# Altium footprint library Cty1.PcbLib: 1378 footprints (part 21 of 87)
Each footprint in its own frame and in the unit in brackets; x right, y up, seen from the top. Pads: shape width x height; smd on the part's side, far side on the other; paste and mask are expansions set on the pad; w line width, h text height; cw(c..) or ccw(c..) is an arc to the next point about the centre after c.
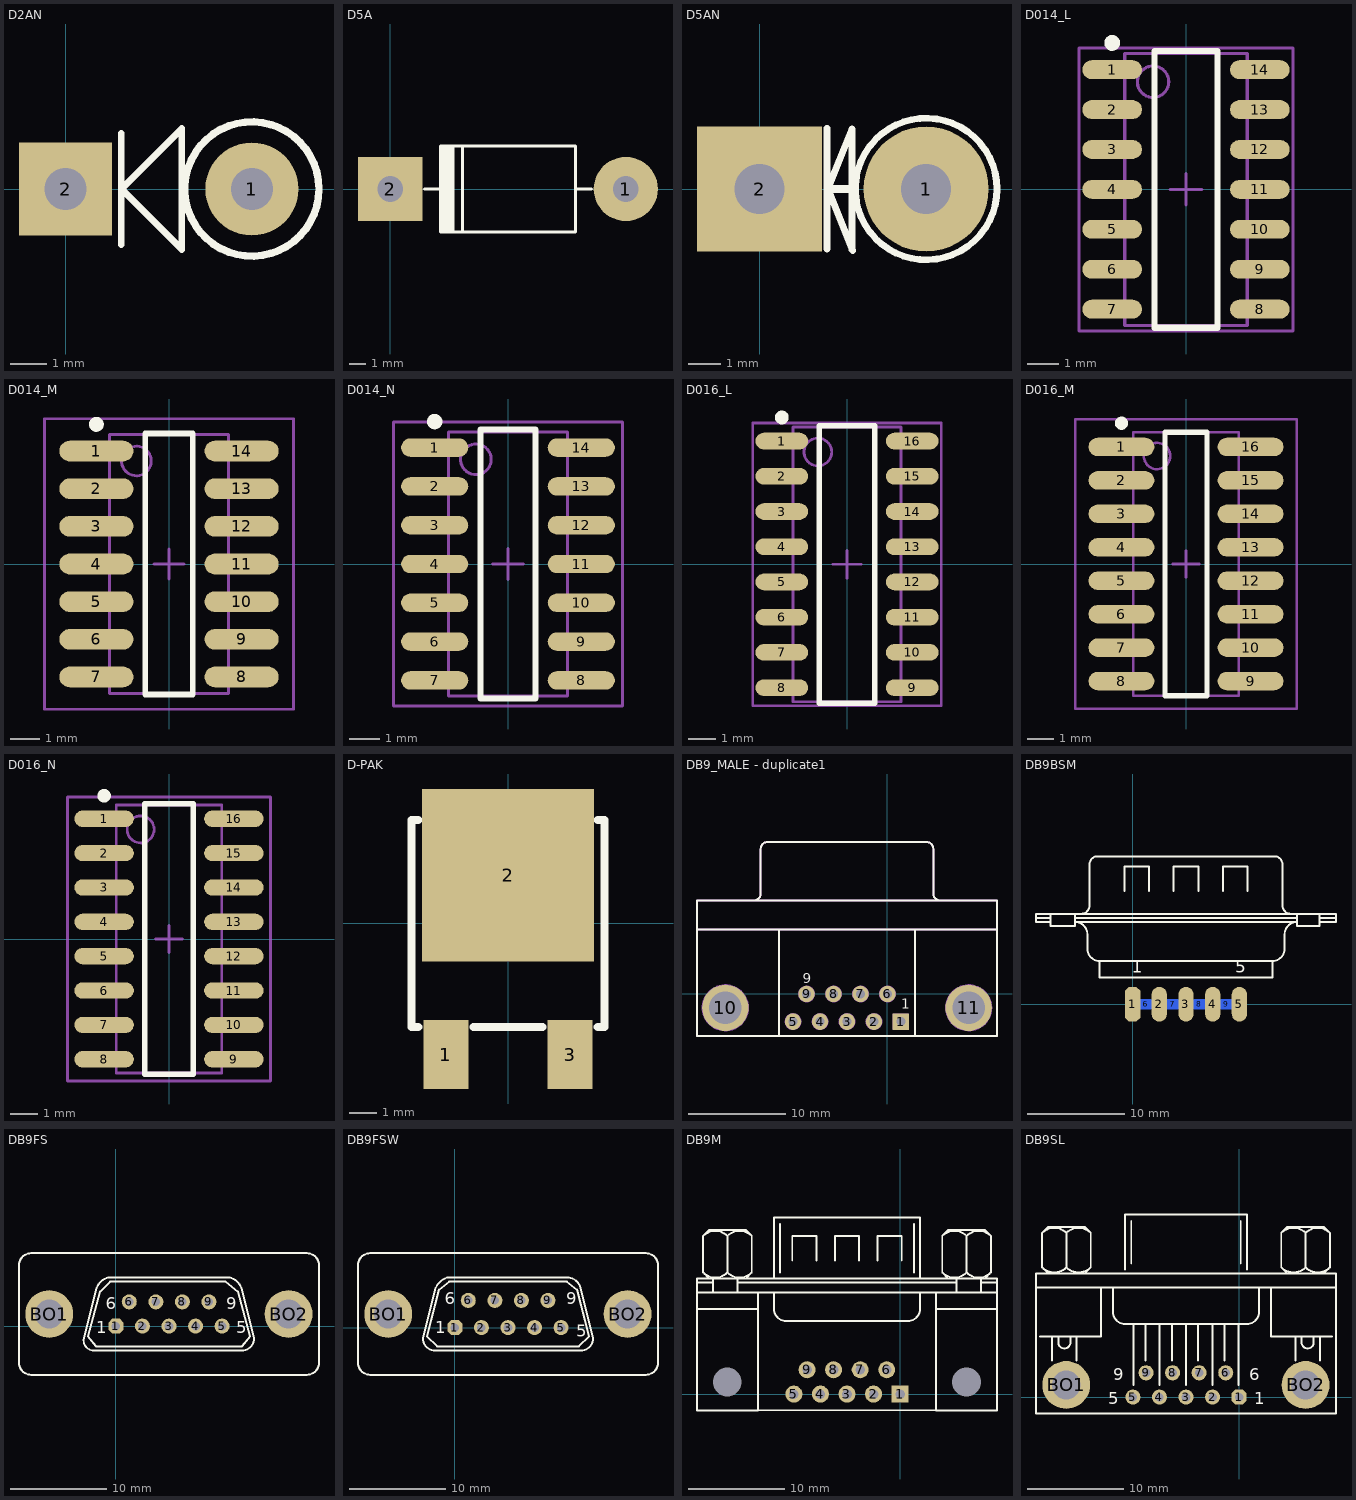
[diagram p20: the footprints below, top view; thin cyan lines are the x and y axes]

## D2AN [mil] "Diode 2A, W 150mil, L 450mil"
height 100
pads (2):
  round 100 hole 45: 1(200,0)
  rect 100x100 hole 45: 2(0,0)
Top Overlay:
  circle w8: c200,0 r72.11
  lines w7: 60,-60 60,60 ; 125,50 125,65 60,0 125,-65 125,55
3D body "SW3dPS-Zener 1W_Stand.STEP": height 252.32, standoff -78.14, extent 46.01,-49.99 214.01,55

## D5A [mil] "Diode 5A, W 200mil, L 550mil"
height 150
pads (2):
  round 150 hole 60: 1(550,0)
  rect 150x150 hole 60: 2(0,0)
Top Overlay:
  rectangle: 120,-100 150,100
  lines w7: 80,0 118,0 ; 118,-44 118,0 ; 118,46 118,0 ; 169,-99 169,100 ; 432,0 470,0 ; 118,-100 118,100 432,100 432,-100 118,-100
3D body "User Library-BYW98.step": height 254.33, standoff -86.22, extent -51.87,-106 589.87,102.66

## D5AN [mil] "Diode 5A, W 200mil, L 250mil"
height 150
pads (2):
  round 150 hole 60: 1(200,0)
  rect 150x150 hole 60: 2(0,0)
Top Overlay:
  circle w8: c200,0 r85
  lines w8: 81,-72 81,73 ; 82,0 111,72 111,-73 ; 83,-2 112,-74
  lines w10: 82,0 113,0
3D body "SW3dPS-Zener 1W_Stand.STEP": height 252.32, standoff -78.14, extent 21,-73.99 189,31

## D014_L [mm] "SOIC, 14-Leads, Body 8.7x3.9mm, Pitch 1.27mm, IPC High Density"
height 1.75
pads (14):
  oval 1.9x0.6 smd: 1(-2.35,3.81) 2(-2.35,2.54) 3(-2.35,1.27) 4(-2.35,0) 5(-2.35,-1.27) 6(-2.35,-2.54) 7(-2.35,-3.81) 8(2.35,-3.81) 9(2.35,-2.54) 10(2.35,-1.27) 11(2.35,0) 12(2.35,1.27) 13(2.35,2.54) 14(2.35,3.81)
Top Overlay:
  circle w0.25: c-2.35,4.66 r0.125
  lines w0.2: -1,-4.4 -1,4.4 1,4.4 1,-4.4 -1,-4.4
Mechanical 13:
  circle w0.1: c-1.05,3.425 r0.5
  lines w0.1: -1.95,-4.325 -1.95,4.325 1.95,4.325 1.95,-4.325 -1.95,-4.325
Mechanical 15:
  lines w0.1: -0.5,0 0.5,0 ; 0,-0.5 0,0.5 ; -3.4,-4.5 -3.4,4.5 3.4,4.5 3.4,-4.5 -3.4,-4.5
3D body: height 1.75, standoff 0, extent -1.95,-4.325 1.95,4.325

## D014_M [mm] "SOIC, 14-Leads, Body 8.7x3.9mm, Pitch 1.27mm, IPC Low Density"
height 1.75
pads (14):
  oval 2.5x0.7 smd: 1(-2.45,3.81) 2(-2.45,2.54) 3(-2.45,1.27) 4(-2.45,0) 5(-2.45,-1.27) 6(-2.45,-2.54) 7(-2.45,-3.81) 8(2.45,-3.81) 9(2.45,-2.54) 10(2.45,-1.27) 11(2.45,0) 12(2.45,1.27) 13(2.45,2.54) 14(2.45,3.81)
Top Overlay:
  circle w0.25: c-2.45,4.71 r0.125
  lines w0.2: -0.8,-4.4 -0.8,4.4 0.8,4.4 0.8,-4.4 -0.8,-4.4
Mechanical 13:
  circle w0.1: c-1.1,3.475 r0.5
  lines w0.1: -2,-4.375 -2,4.375 2,4.375 2,-4.375 -2,-4.375
Mechanical 15:
  lines w0.1: -0.5,0 0.5,0 ; 0,-0.5 0,0.5 ; -4.2,-4.9 -4.2,4.9 4.2,4.9 4.2,-4.9 -4.2,-4.9
3D body: height 1.75, standoff 0, extent -2,-4.375 2,4.375

## D014_N [mm] "SOIC, 14-Leads, Body 8.7x3.9mm, Pitch 1.27mm, IPC Medium Density"
height 1.75
pads (14):
  oval 2.2x0.6 smd: 1(-2.4,3.81) 2(-2.4,2.54) 3(-2.4,1.27) 4(-2.4,0) 5(-2.4,-1.27) 6(-2.4,-2.54) 7(-2.4,-3.81) 8(2.4,-3.81) 9(2.4,-2.54) 10(2.4,-1.27) 11(2.4,0) 12(2.4,1.27) 13(2.4,2.54) 14(2.4,3.81)
Top Overlay:
  circle w0.25: c-2.4,4.66 r0.125
  lines w0.2: -0.9,-4.4 -0.9,4.4 0.9,4.4 0.9,-4.4 -0.9,-4.4
Mechanical 13:
  circle w0.1: c-1.05,3.425 r0.5
  lines w0.1: -1.95,-4.325 -1.95,4.325 1.95,4.325 1.95,-4.325 -1.95,-4.325
Mechanical 15:
  lines w0.1: -0.5,0 0.5,0 ; 0,-0.5 0,0.5 ; -3.75,-4.65 -3.75,4.65 3.75,4.65 3.75,-4.65 -3.75,-4.65
3D body: height 1.75, standoff 0, extent -1.95,-4.325 1.95,4.325

## D016_L [mm] "SOIC, 16-Leads, Body 9.9x3.9mm, Pitch 1.27mm, IPC High Density"
height 1.75
pads (16):
  oval 1.9x0.6 smd: 1(-2.35,4.445) 2(-2.35,3.175) 3(-2.35,1.905) 4(-2.35,0.635) 5(-2.35,-0.635) 6(-2.35,-1.905) 7(-2.35,-3.175) 8(-2.35,-4.445) 9(2.35,-4.445) 10(2.35,-3.175) 11(2.35,-1.905) 12(2.35,-0.635) 13(2.35,0.635) 14(2.35,1.905) 15(2.35,3.175) 16(2.35,4.445)
Top Overlay:
  circle w0.25: c-2.35,5.295 r0.125
  lines w0.2: -1,-5 -1,5 1,5 1,-5 -1,-5
Mechanical 13:
  circle w0.1: c-1.05,4.05 r0.5
  lines w0.1: -1.95,-4.95 -1.95,4.95 1.95,4.95 1.95,-4.95 -1.95,-4.95
Mechanical 15:
  lines w0.1: -0.5,0 0.5,0 ; 0,-0.5 0,0.5 ; -3.4,-5.1 -3.4,5.1 3.4,5.1 3.4,-5.1 -3.4,-5.1
3D body: height 1.75, standoff 0, extent -1.95,-4.95 1.95,4.95

## D016_M [mm] "SOIC, 16-Leads, Body 9.9x3.9mm, Pitch 1.27mm, IPC Low Density"
height 1.75
pads (16):
  oval 2.5x0.7 smd: 1(-2.45,4.445) 2(-2.45,3.175) 3(-2.45,1.905) 4(-2.45,0.635) 5(-2.45,-0.635) 6(-2.45,-1.905) 7(-2.45,-3.175) 8(-2.45,-4.445) 9(2.45,-4.445) 10(2.45,-3.175) 11(2.45,-1.905) 12(2.45,-0.635) 13(2.45,0.635) 14(2.45,1.905) 15(2.45,3.175) 16(2.45,4.445)
Top Overlay:
  circle w0.25: c-2.45,5.345 r0.125
  lines w0.2: -0.8,-5 0.8,-5 0.8,5 -0.8,5 -0.8,-5
Mechanical 13:
  circle w0.1: c-1.1,4.1 r0.5
  lines w0.1: -2,-5 2,-5 2,5 -2,5 -2,-5
Mechanical 15:
  lines w0.1: -0.5,0 0.5,0 ; 0,-0.5 0,0.5 ; -4.2,-5.5 4.2,-5.5 4.2,5.5 -4.2,5.5 -4.2,-5.5
3D body: height 1.75, standoff 0, extent -2,-5 2,5

## D016_N [mm] "SOIC, 16-Leads, Body 9.9x3.9mm, Pitch 1.27mm, IPC Medium Density"
height 1.75
pads (16):
  oval 2.2x0.6 smd: 1(-2.4,4.445) 2(-2.4,3.175) 3(-2.4,1.905) 4(-2.4,0.635) 5(-2.4,-0.635) 6(-2.4,-1.905) 7(-2.4,-3.175) 8(-2.4,-4.445) 9(2.4,-4.445) 10(2.4,-3.175) 11(2.4,-1.905) 12(2.4,-0.635) 13(2.4,0.635) 14(2.4,1.905) 15(2.4,3.175) 16(2.4,4.445)
Top Overlay:
  circle w0.25: c-2.4,5.295 r0.125
  lines w0.2: -0.9,-5 0.9,-5 0.9,5 -0.9,5 -0.9,-5
Mechanical 13:
  circle w0.1: c-1.05,4.05 r0.5
  lines w0.1: -1.95,-4.95 1.95,-4.95 1.95,4.95 -1.95,4.95 -1.95,-4.95
Mechanical 15:
  lines w0.1: -0.5,0 0.5,0 ; 0,-0.5 0,0.5 ; -3.75,-5.25 3.75,-5.25 3.75,5.25 -3.75,5.25 -3.75,-5.25
3D body: height 1.75, standoff 0, extent -1.95,-4.95 1.95,4.95

## D-PAK [mil]
pads (3):
  rect 65x100 smd: 1(-90,-190) 3(90,-190)
  rect 250x250 smd: 2(0,70)
Top Overlay:
  lines w12: -130,-150 -140,-150 -140,150 -130,150 ; -50,-150 50,-150 ; 130,-150 140,-150 140,150 130,150
3D body "User Library-TO252AA.step": height 90.55, standoff -0.35, extent -130,-210.95 129.06,170.95

## DB9_MALE - duplicate1 [mm]
pads (11):
  rect 1.69x1.69 hole 0.9: 1(1.385,-2.84)
  round 1.69 hole 0.9: 2(-1.385,-2.84) 3(-4.155,-2.84) 4(-6.925,-2.84) 5(-9.695,-2.84) 6(0,0) 7(-2.77,0) 8(-5.54,0) 9(-8.31,0)
  round 4.76 hole 3.3: 10(-16.65,-1.42) 11(8.34,-1.42)
Top Overlay:
  lines w0.2: -19.555,6.604 11.245,6.604 ; -13.715,9.609 ccw(c-13.715,10.304) -13.02,10.304 -13.02,14.904 ; -13.015,14.909 cw(c-12.32,14.909) -12.32,15.604 4.01,15.604 cw(c4.01,14.909) 4.705,14.909 ; -11.155,-4.32 -11.155,6.604 ; 2.845,-4.32 2.845,6.604 ; 4.71,14.904 4.71,10.304 ccw(c5.405,10.304) 5.405,9.609 ; -19.555,-4.32 -19.555,9.604 11.245,9.604 11.245,-4.32 -19.555,-4.32
  text "1" at 1.4,-1.5 h1
  text "9" at -8.709,1.095 h1
Mechanical 7:
  circle w0.2: c-1.385,-2.84 r0.773
  circle w0.2: c-4.155,-2.84 r0.773
  circle w0.2: c-6.925,-2.84 r0.773
  circle w0.2: c-9.695,-2.84 r0.773
  circle w0.2: c-8.31,0 r0.773
  circle w0.2: c-5.54,0 r0.773
  circle w0.2: c-2.77,0 r0.773
  circle w0.2: c0,0 r0.773
  circle w0.2: c8.34,-1.42 r2.327
  circle w0.2: c-16.65,-1.42 r2.327
  lines w0.2: -19.555,6.604 11.245,6.604 ; -13.715,9.609 ccw(c-13.715,10.304) -13.02,10.304 -13.02,14.904 ; -13.015,14.909 cw(c-12.32,14.909) -12.32,15.604 4.01,15.604 cw(c4.01,14.909) 4.705,14.909 ; -11.155,-4.32 -11.155,6.604 ; 2.845,-4.32 2.845,6.604 ; 4.71,14.904 4.71,10.304 ccw(c5.405,10.304) 5.405,9.609 ; -19.555,-4.32 11.245,-4.32 11.245,9.604 -19.555,9.604 -19.555,-4.32 ; 0.635,-3.59 2.135,-3.59 2.135,-2.09 0.635,-2.09 0.635,-2.84 0.635,-3.59
3D body "SW3DPS-DB9RA_copy.STEP": height 12.66, standoff -3.39, extent -19.848,-4.328 11.466,16.376
3D body: height 4, standoff -3, extent -18.067,-1.549 -17.122,-1.095
3D body: height 4, standoff -3, extent -16.299,-1.641 -15.232,-0.912
3D body: height 4, standoff -3, extent 6.914,-1.537 7.981,-0.808
3D body: height 4, standoff -3, extent 8.804,-1.354 9.749,-0.899
3D body: height 4.5, standoff 4, extent 6.626,-0.892 10.169,5.789
3D body: height 4.5, standoff 4, extent -18.528,-1.113 -14.985,5.568

## DB9BSM [mm]
pads (9):
  oct 1.587x3.598 smd: 1(0,0)
  oval 1.587x3.598 smd: 2(2.752,0) 3(5.503,0) 4(8.255,0) 5(11.007,0)
  oval 2x1 smd far side: 6(1.376,0) 7(4.127,0) 8(6.879,0) 9(9.631,0)
Top Overlay:
  lines w0.203: -9.948,8.89 -8.467,8.89 ; -8.467,8.467 -9.948,8.467 -9.948,9.313 20.955,9.313 20.955,8.467 19.262,8.467 ; -8.467,9.313 -8.467,8.043 -5.927,8.043 -5.927,9.313 ; -5.927,8.89 16.933,8.89 ; -5.292,9.313 ccw(c-5.292,10.16) -4.445,10.16 -4.445,14.393 cw(c-3.598,14.393) -3.598,15.24 14.605,15.24 cw(c14.605,14.393) 15.452,14.393 15.452,10.16 ccw(c16.298,10.16) 16.298,9.313 ; -0.847,11.642 -0.847,14.182 1.693,14.182 1.693,11.642 ; 4.233,11.642 4.233,14.182 6.773,14.182 6.773,11.642 ; 9.313,11.642 9.313,14.182 11.853,14.182 11.853,11.642 ; 16.933,9.313 16.933,8.043 19.262,8.043 19.262,9.313 ; 19.262,8.89 20.955,8.89 ; -3.387,4.445 cw(c-3.387,5.715) -4.657,5.715 -4.657,7.197 ccw(c-5.927,7.197) -5.927,8.467 16.933,8.467 ccw(c16.933,7.197) 15.663,7.197 15.663,5.715 cw(c14.393,5.715) 14.393,4.445 ; -3.387,4.445 14.393,4.445 ; -3.387,4.445 -3.387,2.752 14.393,2.752 14.393,4.445
  text "5" at 10.583,3.26 h1.27
  text "1" at -0.085,3.26 h1.27

## DB9FS [mil]
pads (11):
  oct 62x62 hole 35: 1(0,0)
  round 62 hole 35: 2(109.17,0) 3(218.33,0) 4(327.5,0) 5(436.67,0) 6(55,100) 7(164.17,100) 8(273.33,100) 9(382.5,100)
  round 196.67 hole 118.33: BO1(-274.17,50) BO2(710,50)
Top Overlay:
  lines w8: -131.72,-50.22 ccw(c-90,-58.33) -81.89,-100.05 ; -131.67,-50 -81.67,150 ; -81.67,-100 518.33,-100 ccw(c518.33,-50) 568.33,-50 518.33,150 ; -81.3,149.86 cw(c-15,133.33) -31.53,199.64 ; -31.67,200 468.33,200 ; 468.2,199.64 cw(c451.67,133.33) 517.97,149.86 ; -398.33,-150 ccw(c-348.33,-150) -348.33,-200 785,-200 ccw(c785,-150) 835,-150 835,250 ccw(c785,250) 785,300 -348.33,300 ccw(c-348.33,250) -398.33,250 -398.33,-150 ; -115,-41.67 -81.67,-83.33 518.33,-83.33 551.67,-41.67 501.67,141.67 451.67,183.33 -23.33,183.33 -65,141.67 -115,-41.67
  text "9" at 454.03,70.2 h50
  text "6" at -41.67,70 h50
  text "5" at 494.63,-29.7 h50
  text "1" at -81.67,-30 h50

## DB9FSW [mil]
pads (11):
  oct 62x62 hole 35: 1(0,0)
  round 62 hole 35: 2(109.17,0) 3(218.33,0) 4(327.5,0) 5(436.67,0) 6(55,111.67) 7(164.17,111.67) 8(273.33,111.67) 9(382.5,111.67)
  round 196.67 hole 118.33: BO1(-274.17,55.83) BO2(710,55.83)
Top Overlay:
  lines w8: -398.33,255.83 cw(c-348.33,255.83) -348.33,305.83 785,305.83 cw(c785,255.83) 835,255.83 835,-144.17 cw(c785,-144.17) 785,-194.17 -348.33,-194.17 cw(c-348.33,-144.17) -398.33,-144.17 -398.33,264.17 ; -81.67,155.83 -131.67,-44.17 ccw(c-81.67,-44.17) -81.67,-94.17 518.33,-94.17 ccw(c518.33,-44.17) 568.33,-44.17 518.33,155.83 ; -78.99,163.03 cw(c-6.67,130.83) -31.13,206.12 ; -31.67,205.83 468.33,205.83 ; 468.23,206.09 cw(c460,147.5) 518.59,155.73 ; -115,-35.83 -65,155.83 -23.33,189.17 460,189.17 501.67,155.83 551.67,-35.83 510,-77.5 -73.33,-77.5 -115,-35.83
  text "6" at -41.67,95.83 h50
  text "1" at -81.67,-24.17 h50
  text "5" at 499.33,-37.97 h50
  text "9" at 458.33,95.83 h50

## DB9M [mil]
pads (11):
  rect 70x70 hole 39.37 unplated: 1(0,0)
  round 70 hole 39.37 unplated: 2(-109.17,0) 3(-218.33,0) 4(-327.5,0) 5(-436.67,0) 6(-55,100) 7(-164.17,100) 8(-273.33,100) 9(-382.5,100)
  round 70 hole 118.11 unplated: ""(-710.83,50) ""(273.33,50)
Top Overlay:
  lines w7.87: -619,-66.67 210,-66.67
  lines w8: -835,350 -585,350 ; -835,416.67 398.33,416.67 ; -835,458.33 -768.33,458.33 ; -810.09,499.91 ccw(c-760,550) -709.91,499.91 ; -810.09,650.09 cw(c-760,600) -709.91,650.09 ; -785,475 -810,500 -810,650 -785,675 -635,675 -610,650 -610,500 -635,475 ; -768.33,416.67 -768.33,475 ; -710.09,499.91 ccw(c-660,550) -609.91,499.91 ; -710.09,650.09 cw(c-660,600) -609.91,650.09 ; -710,500 -710,650 ; -668.33,416.67 -668.33,475 ; -668.33,458.33 231.67,458.33 ; -585,416.67 -585,-66.67 -835,-66.67 -835,475 398.33,475 398.33,-66.67 148.33,-66.67 148.33,416.67 ; -518.33,416.67 -518.33,350 ccw(c-468.33,350) -468.33,300 31.67,300 ccw(c31.67,350) 81.67,350 81.67,416.67 ; -518.33,475 -518.33,725 81.67,725 81.67,475 ; -493.33,500 -493.33,700 ; -443.33,550 -443.33,650 -343.33,650 -343.33,550 ; -268.33,550 -268.33,650 -168.33,650 -168.33,550 ; -93.33,550 -93.33,650 6.67,650 6.67,550 ; 56.67,500 56.67,700 ; 148.33,350 398.33,350 ; 173.25,499.91 ccw(c223.33,550) 273.42,499.91 ; 173.25,650.09 cw(c223.33,600) 273.42,650.09 ; 198.33,475 173.33,500 173.33,650 198.33,675 348.33,675 373.33,650 373.33,500 348.33,475 ; 231.67,416.67 231.67,475 ; 273.25,499.91 ccw(c323.33,550) 373.42,499.91 ; 273.25,650.09 cw(c323.33,600) 373.42,650.09 ; 273.33,500 273.33,650 ; 331.67,416.67 331.67,475 ; 331.67,458.33 398.33,458.33

## DB9SL [mil]
pads (11):
  oct 62x62 hole 35: 1(0,0)
  round 62 hole 35: 2(-109.17,0) 3(-218.33,0) 4(-327.5,0) 5(-436.67,0) 6(-55,100) 7(-164.17,100) 8(-273.33,100) 9(-382.5,100)
  round 196.67 hole 118.33: BO1(-710.83,50) BO2(273.33,50)
Top Overlay:
  lines w8: -835,450 398.33,450 ; -818.33,250 -568.33,250 -568.33,450 ; -810.09,533.25 ccw(c-760,583.33) -709.91,533.25 ; -810.09,675.09 cw(c-760,625) -709.91,675.09 ; -785,508.33 -810,533.33 -810,675 -785,700 -635,700 -610,675 -610,533.33 -635,508.33 ; -768.33,150 -768.33,250 ; -743.33,250 -743.33,225 ccw(c-718.33,225) -693.33,225 -693.33,250 ; -710.09,533.25 ccw(c-660,583.33) -609.91,533.25 ; -710.09,675.09 cw(c-660,625) -609.91,675.09 ; -710,533.33 -710,675 ; -668.33,150 -668.33,250 ; -518.33,450 -518.33,350 ccw(c-468.33,350) -468.33,300 31.67,300 ccw(c31.67,350) 81.67,350 81.67,450 ; -468.33,525 -468.33,750 31.67,750 31.67,525 ; -443.33,550 -443.33,725 ; -435,50 -435,300 ; -385,150 -385,300 ; -326.67,50 -326.67,300 ; -276.67,150 -276.67,300 ; -218.33,50 -218.33,300 ; -168.33,150 -168.33,300 ; -110,50 -110,300 ; -60,150 -60,158.33 -60,300 ; -1.67,50 -1.67,300 ; 6.67,550 6.67,725 ; 131.67,450 131.67,250 381.67,250 ; 173.25,533.25 ccw(c223.33,583.33) 273.42,533.25 ; 173.25,675.09 cw(c223.33,625) 273.42,675.09 ; 198.33,508.33 173.33,533.33 173.33,675 198.33,700 348.33,700 373.33,675 373.33,533.33 348.33,508.33 ; 231.67,150 231.67,250 ; 256.67,250 256.67,225 ccw(c281.67,225) 306.67,225 306.67,250 ; 273.25,533.25 ccw(c323.33,583.33) 373.42,533.25 ; 273.25,675.09 cw(c323.33,625) 373.42,675.09 ; 273.33,533.33 273.33,675 ; 331.67,150 331.67,250 ; -835,-66.67 -835,508.33 398.33,508.33 398.33,-66.67 -835,-66.67
  text "9" at -518.33,70 h50
  text "5" at -538.33,-30 h50
  text "1" at 61.67,-30 h50
  text "6" at 41.67,70 h50